# Altium footprint library Ixora.PcbLib: 199 footprints (part 6 of 13)
Each footprint in its own frame and in the unit in brackets; x right, y up, seen from the top. Pads: shape width x height; smd on the part's side, far side on the other; paste and mask are expansions set on the pad; w line width, h text height; cw(c..) or ccw(c..) is an arc to the next point about the centre after c.
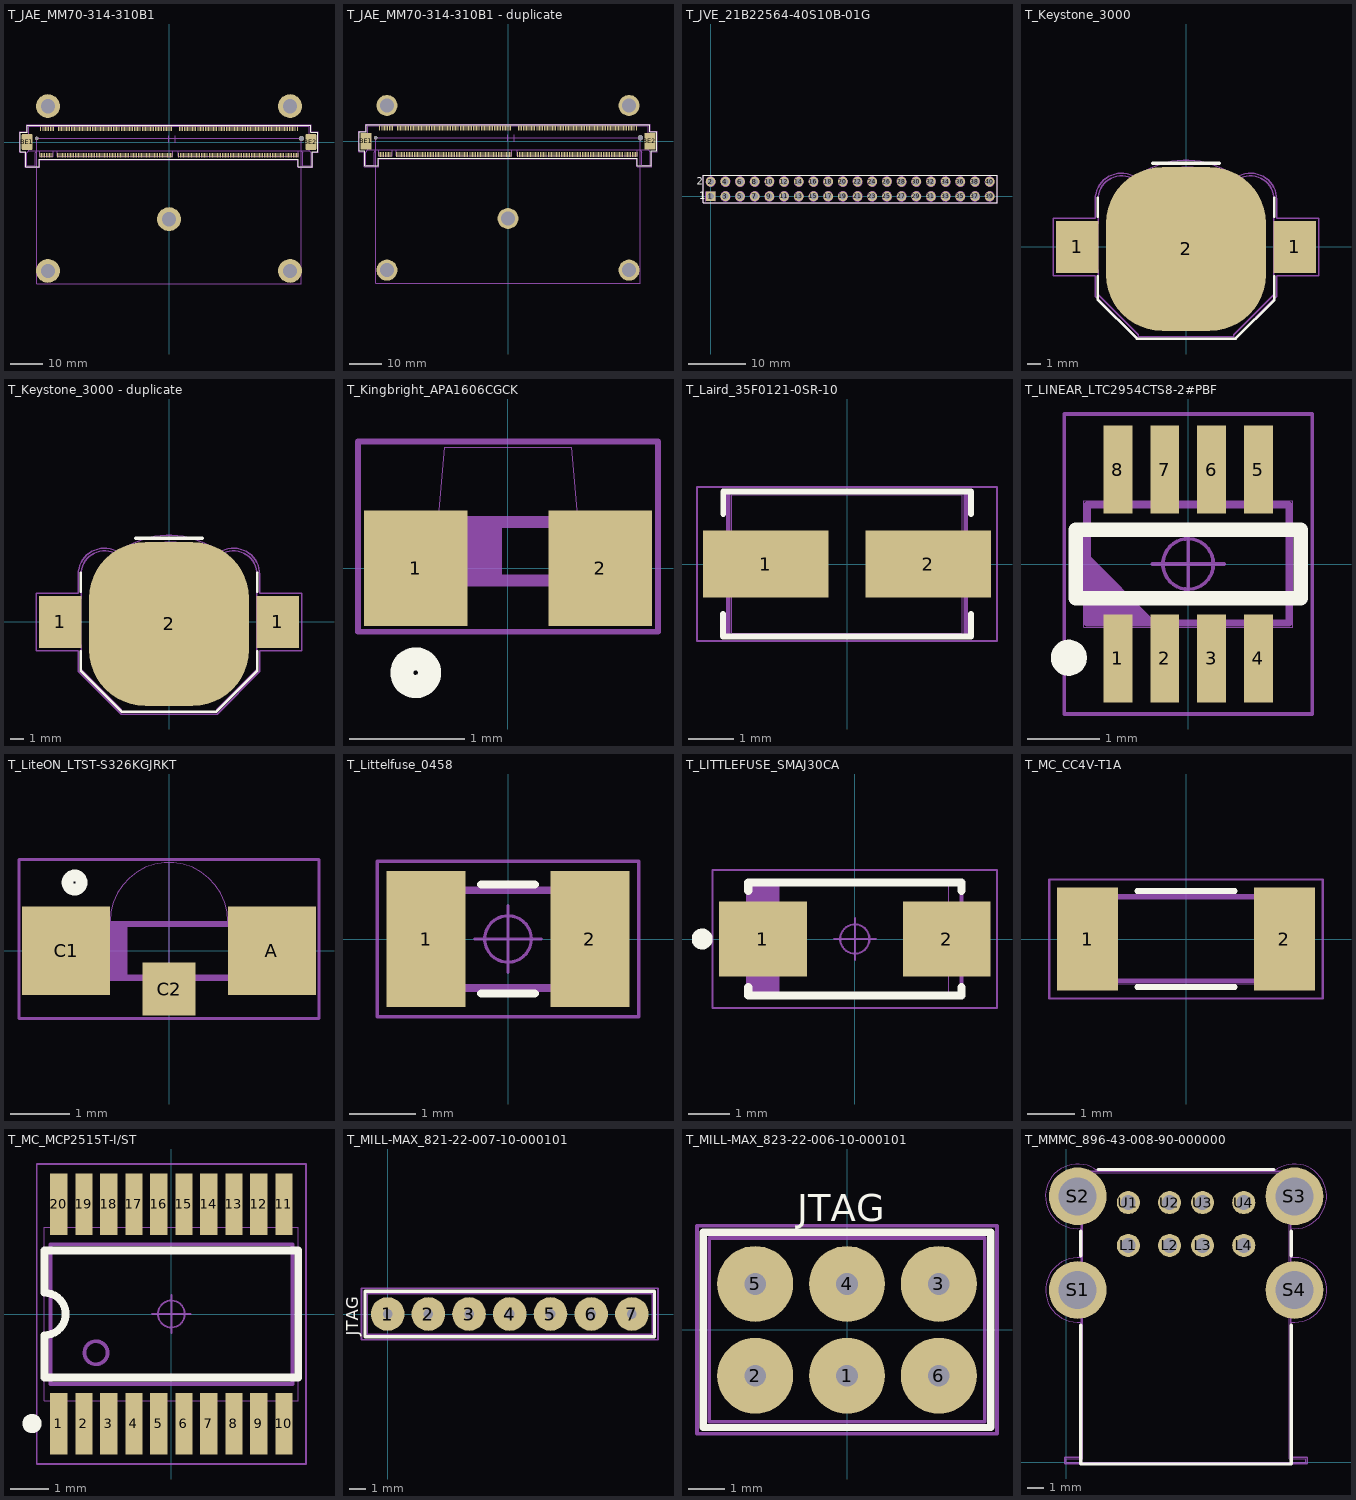
[diagram p5: the footprints below, top view; thin cyan lines are the x and y axes]

## T_JAE_MM70-314-310B1 [mm] "MXM 3.0 Connector"
height 6.7
pads (319):
  rrect50% 0.3x1.5 smd: 1(-40,-4.1) 2(-39.75,4.1) 3(-39.5,-4.1) 4(-39.25,4.1) 5(-39,-4.1) 6(-38.75,4.1) 7(-38.5,-4.1) 8(-38.25,4.1) 9(-38,-4.1) 10(-37.75,4.1) 11(-37.5,-4.1) 12(-37.25,4.1) 13(-37,-4.1) 14(-36.75,4.1) 15(-36.5,-4.1) 16(-36.25,4.1) 17(-36,-4.1) 18(-35.75,4.1) 23(-34.5,-4.1) 24(-34.25,4.1) 25(-34,-4.1) 26(-33.75,4.1) 27(-33.5,-4.1) 28(-33.25,4.1) 29(-33,-4.1) 30(-32.75,4.1) 31(-32.5,-4.1) 32(-32.25,4.1) 33(-32,-4.1) 34(-31.75,4.1) 35(-31.5,-4.1) 36(-31.25,4.1) 37(-31,-4.1) 38(-30.75,4.1) 39(-30.5,-4.1) 40(-30.25,4.1) 41(-30,-4.1) 42(-29.75,4.1) 43(-29.5,-4.1) 44(-29.25,4.1) 45(-29,-4.1) 46(-28.75,4.1) 47(-28.5,-4.1) 48(-28.25,4.1) 49(-28,-4.1) 50(-27.75,4.1) 51(-27.5,-4.1) 52(-27.25,4.1) 53(-27,-4.1) 54(-26.75,4.1) 55(-26.5,-4.1) 56(-26.25,4.1) 57(-26,-4.1) 58(-25.75,4.1) 59(-25.5,-4.1) 60(-25.25,4.1) 61(-25,-4.1) 62(-24.75,4.1) 63(-24.5,-4.1) 64(-24.25,4.1) 65(-24,-4.1) 66(-23.75,4.1) 67(-23.5,-4.1) 68(-23.25,4.1) 69(-23,-4.1) 70(-22.75,4.1) 71(-22.5,-4.1) 72(-22.25,4.1) 73(-22,-4.1) 74(-21.75,4.1) 75(-21.5,-4.1) 76(-21.25,4.1) 77(-21,-4.1) 78(-20.75,4.1) 79(-20.5,-4.1) 80(-20.25,4.1) 81(-20,-4.1) 82(-19.75,4.1) 83(-19.5,-4.1) 84(-19.25,4.1) 85(-19,-4.1) 86(-18.75,4.1) 87(-18.5,-4.1) 88(-18.25,4.1) 89(-18,-4.1) 90(-17.75,4.1) 91(-17.5,-4.1) 92(-17.25,4.1) 93(-17,-4.1) 94(-16.75,4.1) 95(-16.5,-4.1) 96(-16.25,4.1) 97(-16,-4.1) 98(-15.75,4.1) 99(-15.5,-4.1) 100(-15.25,4.1) 101(-15,-4.1) 102(-14.75,4.1) 103(-14.5,-4.1) 104(-14.25,4.1) 105(-14,-4.1) 106(-13.75,4.1) 107(-13.5,-4.1) 108(-13.25,4.1) 109(-13,-4.1) 110(-12.75,4.1) 111(-12.5,-4.1) 112(-12.25,4.1) 113(-12,-4.1) 114(-11.75,4.1) 115(-11.5,-4.1) 116(-11.25,4.1) 117(-11,-4.1) 118(-10.75,4.1) 119(-10.5,-4.1) 120(-10.25,4.1) 121(-10,-4.1) 122(-9.75,4.1) 123(-9.5,-4.1) 124(-9.25,4.1) 125(-9,-4.1) 126(-8.75,4.1) 127(-8.5,-4.1) 128(-8.25,4.1) 129(-8,-4.1) 130(-7.75,4.1) 131(-7.5,-4.1) 132(-7.25,4.1) 133(-7,-4.1) 134(-6.75,4.1) 135(-6.5,-4.1) 136(-6.25,4.1) 137(-6,-4.1) 138(-5.75,4.1) 139(-5.5,-4.1) 140(-5.25,4.1) 141(-5,-4.1) 142(-4.75,4.1) 143(-4.5,-4.1) 144(-4.25,4.1) 145(-4,-4.1) 146(-3.75,4.1) 147(-3.5,-4.1) 148(-3.25,4.1) 149(-3,-4.1) 150(-2.75,4.1) 151(-2.5,-4.1) 152(-2.25,4.1) 153(-2,-4.1) 154(-1.75,4.1) 155(-1.5,-4.1) 156(-1.25,4.1) 157(-1,-4.1) 158(-0.75,4.1) 159(-0.5,-4.1) 160(-0.25,4.1) 161(0,-4.1) 162(0.25,4.1) 163(0.5,-4.1) 164(0.75,4.1) 165(1,-4.1) 173(3,-4.1) 174(3.25,4.1) 175(3.5,-4.1) 176(3.75,4.1) 177(4,-4.1) 178(4.25,4.1) 179(4.5,-4.1) 180(4.75,4.1) 181(5,-4.1) 182(5.25,4.1) 183(5.5,-4.1) 184(5.75,4.1) 185(6,-4.1) 186(6.25,4.1) 187(6.5,-4.1) 188(6.75,4.1) 189(7,-4.1) 190(7.25,4.1) 191(7.5,-4.1) 192(7.75,4.1) 193(8,-4.1) 194(8.25,4.1) 195(8.5,-4.1) 196(8.75,4.1) 197(9,-4.1) 198(9.25,4.1) 199(9.5,-4.1) 200(9.75,4.1) 201(10,-4.1) 202(10.25,4.1) 203(10.5,-4.1) 204(10.75,4.1) 205(11,-4.1) 206(11.25,4.1) 207(11.5,-4.1) 208(11.75,4.1) 209(12,-4.1) 210(12.25,4.1) 211(12.5,-4.1) 212(12.75,4.1) 213(13,-4.1) 214(13.25,4.1) 215(13.5,-4.1) 216(13.75,4.1) 217(14,-4.1) 218(14.25,4.1) 219(14.5,-4.1) 220(14.75,4.1) 221(15,-4.1) 222(15.25,4.1) 223(15.5,-4.1) 224(15.75,4.1) 225(16,-4.1) 226(16.25,4.1) 227(16.5,-4.1) 228(16.75,4.1) 229(17,-4.1) 230(17.25,4.1) 231(17.5,-4.1) 232(17.75,4.1) 233(18,-4.1) 234(18.25,4.1) 235(18.5,-4.1) 236(18.75,4.1) 237(19,-4.1) 238(19.25,4.1) 239(19.5,-4.1) 240(19.75,4.1) 241(20,-4.1) 242(20.25,4.1) 243(20.5,-4.1) 244(20.75,4.1) 245(21,-4.1) 246(21.25,4.1) 247(21.5,-4.1) 248(21.75,4.1) 249(22,-4.1) 250(22.25,4.1) 251(22.5,-4.1) 252(22.75,4.1) 253(23,-4.1) 254(23.25,4.1) 255(23.5,-4.1) 256(23.75,4.1) 257(24,-4.1) 258(24.25,4.1) 259(24.5,-4.1) 260(24.75,4.1) 261(25,-4.1) 262(25.25,4.1) 263(25.5,-4.1) 264(25.75,4.1) 265(26,-4.1) 266(26.25,4.1) 267(26.5,-4.1) 268(26.75,4.1) 269(27,-4.1) 270(27.25,4.1) 271(27.5,-4.1) 272(27.75,4.1) 273(28,-4.1) 274(28.25,4.1) 275(28.5,-4.1) 276(28.75,4.1) 277(29,-4.1) 278(29.25,4.1) 279(29.5,-4.1) 280(29.75,4.1) 281(30,-4.1) 282(30.25,4.1) 283(30.5,-4.1) 284(30.75,4.1) 285(31,-4.1) 286(31.25,4.1) 287(31.5,-4.1) 288(31.75,4.1) 289(32,-4.1) 290(32.25,4.1) 291(32.5,-4.1) 292(32.75,4.1) 293(33,-4.1) 294(33.25,4.1) 295(33.5,-4.1) 296(33.75,4.1) 297(34,-4.1) 298(34.25,4.1) 299(34.5,-4.1) 300(34.75,4.1) 301(35,-4.1) 302(35.25,4.1) 303(35.5,-4.1) 304(35.75,4.1) 305(36,-4.1) 306(36.25,4.1) 307(36.5,-4.1) 308(36.75,4.1) 309(37,-4.1) 310(37.25,4.1) 311(37.5,-4.1) 312(37.75,4.1) 313(38,-4.1) 314(38.25,4.1) 315(38.5,-4.1) 316(38.75,4.1) 317(39,-4.1) 318(39.25,4.1) 319(39.5,-4.1) 320(39.75,4.1) 321(40,-4.1)
  rrect25% 3.3x5 smd: BE1(-43.95,0) BE2(43.95,0)
  round 1.1 hole 1.1 unplated: ""(-41,1.1)
  round 7.4 / inner round 0 / far side round 0 hole 4.4 unplated: ""(-37.5,-39.9) ""(-37.5,11.1) ""(0,-23.9) ""(37.5,-39.9) ""(37.5,11.1)
  round 1.6 hole 1.6 unplated: ""(41,1.1)
Top Overlay:
  lines w0.2: -46.069,-3 -46.069,3 -43.82,3 -43.82,5.17 43.87,5.17 43.87,3 46.069,3 46.069,-3 44.33,-3 44.33,-7.65 40.09,-7.65 40.09,-5.29 -40.12,-5.29 -40.12,-7.65 -44.33,-7.65 -44.33,-3 -46.069,-3
Top Paste:
  drawing of 20 lines, arcs and shapes, not listed
Mechanical 3:
  lines w0.1: -40.9,-2.65 -41.4,-3.35 -41.4,-7.35 -44,-7.35 -44,-3.35 -43.5,-2.65 ; -40.1,-2.65 -40.1,-4.45 -35.9,-4.45 -35.9,-2.65 ; -34.6,-2.65 -34.6,-4.45 1.1,-4.45 1.1,-2.65 ; 2.9,-2.65 2.9,-4.45 40.1,-4.45 40.1,-2.65 ; 40.9,-2.65 41.4,-3.35 41.4,-7.35 44,-7.35 44,-3.35 43.5,-2.65 ; -43.5,-2.65 43.5,-2.65 ; -43.5,-2.65 -43.5,-2 -44.95,-2 -44.95,2 -43.5,2 -43.5,4.85 43.5,4.85 43.5,2 44.95,2 44.95,-2 43.5,-2 43.5,-2.65
Mechanical 13:
  circle w0.1: c37.5,11.1 r3
  circle w0.1: c-37.5,11.1 r3
  circle w0.1: c-37.5,-39.9 r3
  circle w0.1: c0,-23.9 r3
  circle w0.1: c37.5,-39.9 r3
  lines w0.001: -40.9,-2.65 -41.4,-3.35 -41.4,-7.35 -44,-7.35 -44,-3.35 -43.5,-2.65 ; -40.1,-2.65 -40.1,-4.45 -35.9,-4.45 -35.9,-2.65 ; -34.6,-2.65 -34.6,-4.45 1.1,-4.45 1.1,-2.65 ; 0,0 0,2 ; 2,0 2,2 ; 2.9,-2.65 2.9,-4.45 40.1,-4.45 40.1,-2.65 ; 40.9,-2.65 41.4,-3.35 41.4,-7.35 44,-7.35 44,-3.35 43.5,-2.65 ; -43.5,-2.65 43.5,-2.65 ; -43.5,-2.65 -43.5,-2 -44.95,-2 -44.95,2 -43.5,2 -43.5,4.85 43.5,4.85 43.5,2 44.95,2 44.95,-2 43.5,-2 43.5,-2.65 ; -41,-43.9 41,-43.9 41,1.1 -41,1.1 -41,-43.9
  lines w0.05: 39.92,-7.82 39.92,-5.46 -39.95,-5.46 -39.95,-7.82 -44.5,-7.82 -44.5,-3.17 -46.24,-3.17 -46.24,3.17 -43.99,3.17 -43.99,5.34 44.04,5.34 44.04,3.16 46.24,3.16 46.24,-3.17 44.5,-3.17 44.5,-7.82 39.95,-7.82
3D body "9774080360.stp": height 8.01, standoff -1.39, extent 34.506,8.1 40.494,14.076
3D body "9774080360.stp": height 8.01, standoff -1.39, extent -40.494,8.1 -34.506,14.076
3D body "CON-JAE-MM70-314-310B1.STEP": height 6.72, standoff -0.98, extent -44.95,-7.35 44.95,4.85
3D body "9774030360.stp": height 3.01, standoff -1.39, extent -40.494,-42.9 -34.506,-36.924
3D body "9774030360.stp": height 3.01, standoff -1.39, extent -2.994,-26.9 2.994,-20.924
3D body "9774030360.stp": height 3.01, standoff -1.39, extent 34.506,-42.9 40.494,-36.924

## T_JAE_MM70-314-310B1 - duplicate [mm] "MXM 3.0 Connector"
height 6.7
pads (319):
  rect 0.3x1.5 smd: 1(-40,-4.1) 2(-39.75,4.1) 3(-39.5,-4.1) 4(-39.25,4.1) 5(-39,-4.1) 6(-38.75,4.1) 7(-38.5,-4.1) 8(-38.25,4.1) 9(-38,-4.1) 10(-37.75,4.1) 11(-37.5,-4.1) 12(-37.25,4.1) 13(-37,-4.1) 14(-36.75,4.1) 15(-36.5,-4.1) 16(-36.25,4.1) 17(-36,-4.1) 18(-35.75,4.1) 23(-34.5,-4.1) 24(-34.25,4.1) 25(-34,-4.1) 26(-33.75,4.1) 27(-33.5,-4.1) 28(-33.25,4.1) 29(-33,-4.1) 30(-32.75,4.1) 31(-32.5,-4.1) 32(-32.25,4.1) 33(-32,-4.1) 34(-31.75,4.1) 35(-31.5,-4.1) 36(-31.25,4.1) 37(-31,-4.1) 38(-30.75,4.1) 39(-30.5,-4.1) 40(-30.25,4.1) 41(-30,-4.1) 42(-29.75,4.1) 43(-29.5,-4.1) 44(-29.25,4.1) 45(-29,-4.1) 46(-28.75,4.1) 47(-28.5,-4.1) 48(-28.25,4.1) 49(-28,-4.1) 50(-27.75,4.1) 51(-27.5,-4.1) 52(-27.25,4.1) 53(-27,-4.1) 54(-26.75,4.1) 55(-26.5,-4.1) 56(-26.25,4.1) 57(-26,-4.1) 58(-25.75,4.1) 59(-25.5,-4.1) 60(-25.25,4.1) 61(-25,-4.1) 62(-24.75,4.1) 63(-24.5,-4.1) 64(-24.25,4.1) 65(-24,-4.1) 66(-23.75,4.1) 67(-23.5,-4.1) 68(-23.25,4.1) 69(-23,-4.1) 70(-22.75,4.1) 71(-22.5,-4.1) 72(-22.25,4.1) 73(-22,-4.1) 74(-21.75,4.1) 75(-21.5,-4.1) 76(-21.25,4.1) 77(-21,-4.1) 78(-20.75,4.1) 79(-20.5,-4.1) 80(-20.25,4.1) 81(-20,-4.1) 82(-19.75,4.1) 83(-19.5,-4.1) 84(-19.25,4.1) 85(-19,-4.1) 86(-18.75,4.1) 87(-18.5,-4.1) 88(-18.25,4.1) 89(-18,-4.1) 90(-17.75,4.1) 91(-17.5,-4.1) 92(-17.25,4.1) 93(-17,-4.1) 94(-16.75,4.1) 95(-16.5,-4.1) 96(-16.25,4.1) 97(-16,-4.1) 98(-15.75,4.1) 99(-15.5,-4.1) 100(-15.25,4.1) 101(-15,-4.1) 102(-14.75,4.1) 103(-14.5,-4.1) 104(-14.25,4.1) 105(-14,-4.1) 106(-13.75,4.1) 107(-13.5,-4.1) 108(-13.25,4.1) 109(-13,-4.1) 110(-12.75,4.1) 111(-12.5,-4.1) 112(-12.25,4.1) 113(-12,-4.1) 114(-11.75,4.1) 115(-11.5,-4.1) 116(-11.25,4.1) 117(-11,-4.1) 118(-10.75,4.1) 119(-10.5,-4.1) 120(-10.25,4.1) 121(-10,-4.1) 122(-9.75,4.1) 123(-9.5,-4.1) 124(-9.25,4.1) 125(-9,-4.1) 126(-8.75,4.1) 127(-8.5,-4.1) 128(-8.25,4.1) 129(-8,-4.1) 130(-7.75,4.1) 131(-7.5,-4.1) 132(-7.25,4.1) 133(-7,-4.1) 134(-6.75,4.1) 135(-6.5,-4.1) 136(-6.25,4.1) 137(-6,-4.1) 138(-5.75,4.1) 139(-5.5,-4.1) 140(-5.25,4.1) 141(-5,-4.1) 142(-4.75,4.1) 143(-4.5,-4.1) 144(-4.25,4.1) 145(-4,-4.1) 146(-3.75,4.1) 147(-3.5,-4.1) 148(-3.25,4.1) 149(-3,-4.1) 150(-2.75,4.1) 151(-2.5,-4.1) 152(-2.25,4.1) 153(-2,-4.1) 154(-1.75,4.1) 155(-1.5,-4.1) 156(-1.25,4.1) 157(-1,-4.1) 158(-0.75,4.1) 159(-0.5,-4.1) 160(-0.25,4.1) 161(0,-4.1) 162(0.25,4.1) 163(0.5,-4.1) 164(0.75,4.1) 165(1,-4.1) 173(3,-4.1) 174(3.25,4.1) 175(3.5,-4.1) 176(3.75,4.1) 177(4,-4.1) 178(4.25,4.1) 179(4.5,-4.1) 180(4.75,4.1) 181(5,-4.1) 182(5.25,4.1) 183(5.5,-4.1) 184(5.75,4.1) 185(6,-4.1) 186(6.25,4.1) 187(6.5,-4.1) 188(6.75,4.1) 189(7,-4.1) 190(7.25,4.1) 191(7.5,-4.1) 192(7.75,4.1) 193(8,-4.1) 194(8.25,4.1) 195(8.5,-4.1) 196(8.75,4.1) 197(9,-4.1) 198(9.25,4.1) 199(9.5,-4.1) 200(9.75,4.1) 201(10,-4.1) 202(10.25,4.1) 203(10.5,-4.1) 204(10.75,4.1) 205(11,-4.1) 206(11.25,4.1) 207(11.5,-4.1) 208(11.75,4.1) 209(12,-4.1) 210(12.25,4.1) 211(12.5,-4.1) 212(12.75,4.1) 213(13,-4.1) 214(13.25,4.1) 215(13.5,-4.1) 216(13.75,4.1) 217(14,-4.1) 218(14.25,4.1) 219(14.5,-4.1) 220(14.75,4.1) 221(15,-4.1) 222(15.25,4.1) 223(15.5,-4.1) 224(15.75,4.1) 225(16,-4.1) 226(16.25,4.1) 227(16.5,-4.1) 228(16.75,4.1) 229(17,-4.1) 230(17.25,4.1) 231(17.5,-4.1) 232(17.75,4.1) 233(18,-4.1) 234(18.25,4.1) 235(18.5,-4.1) 236(18.75,4.1) 237(19,-4.1) 238(19.25,4.1) 239(19.5,-4.1) 240(19.75,4.1) 241(20,-4.1) 242(20.25,4.1) 243(20.5,-4.1) 244(20.75,4.1) 245(21,-4.1) 246(21.25,4.1) 247(21.5,-4.1) 248(21.75,4.1) 249(22,-4.1) 250(22.25,4.1) 251(22.5,-4.1) 252(22.75,4.1) 253(23,-4.1) 254(23.25,4.1) 255(23.5,-4.1) 256(23.75,4.1) 257(24,-4.1) 258(24.25,4.1) 259(24.5,-4.1) 260(24.75,4.1) 261(25,-4.1) 262(25.25,4.1) 263(25.5,-4.1) 264(25.75,4.1) 265(26,-4.1) 266(26.25,4.1) 267(26.5,-4.1) 268(26.75,4.1) 269(27,-4.1) 270(27.25,4.1) 271(27.5,-4.1) 272(27.75,4.1) 273(28,-4.1) 274(28.25,4.1) 275(28.5,-4.1) 276(28.75,4.1) 277(29,-4.1) 278(29.25,4.1) 279(29.5,-4.1) 280(29.75,4.1) 281(30,-4.1) 282(30.25,4.1) 283(30.5,-4.1) 284(30.75,4.1) 285(31,-4.1) 286(31.25,4.1) 287(31.5,-4.1) 288(31.75,4.1) 289(32,-4.1) 290(32.25,4.1) 291(32.5,-4.1) 292(32.75,4.1) 293(33,-4.1) 294(33.25,4.1) 295(33.5,-4.1) 296(33.75,4.1) 297(34,-4.1) 298(34.25,4.1) 299(34.5,-4.1) 300(34.75,4.1) 301(35,-4.1) 302(35.25,4.1) 303(35.5,-4.1) 304(35.75,4.1) 305(36,-4.1) 306(36.25,4.1) 307(36.5,-4.1) 308(36.75,4.1) 309(37,-4.1) 310(37.25,4.1) 311(37.5,-4.1) 312(37.75,4.1) 313(38,-4.1) 314(38.25,4.1) 315(38.5,-4.1) 316(38.75,4.1) 317(39,-4.1) 318(39.25,4.1) 319(39.5,-4.1) 320(39.75,4.1) 321(40,-4.1)
  rect 3.3x5 smd: BE1(-43.95,0) BE2(43.95,0)
  round 1.1 hole 1.1 unplated: ""(-41,1.1)
  round 6.5 hole 4.33: ""(-37.5,-39.9) ""(-37.5,11.1) ""(0,-23.9) ""(37.5,-39.9) ""(37.5,11.1)
  round 1.6 hole 1.6 unplated: ""(41,1.1)
Top Overlay:
  lines w0.2: -46.069,-3 -46.069,3 -43.82,3 -43.82,5.17 43.87,5.17 43.87,3 46.069,3 46.069,-3 44.33,-3 44.33,-7.65 40.09,-7.65 40.09,-5.29 -40.12,-5.29 -40.12,-7.65 -44.33,-7.65 -44.33,-3 -46.069,-3
Mechanical 2:
  lines w0.001: -40.9,-2.65 -41.4,-3.35 -41.4,-7.35 -44,-7.35 -44,-3.35 -43.5,-2.65 ; -40.1,-2.65 -40.1,-4.45 -35.9,-4.45 -35.9,-2.65 ; -34.6,-2.65 -34.6,-4.45 1.1,-4.45 1.1,-2.65 ; 0,0 0,2 ; 2,0 2,2 ; 2.9,-2.65 2.9,-4.45 40.1,-4.45 40.1,-2.65 ; 40.9,-2.65 41.4,-3.35 41.4,-7.35 44,-7.35 44,-3.35 43.5,-2.65 ; -43.5,-2.65 -43.5,-2 -44.95,-2 -44.95,2 -43.5,2 -43.5,4.85 43.5,4.85 43.5,2 44.95,2 44.95,-2 43.5,-2 43.5,-2.65 ; -43.5,-2.65 43.5,-2.65 ; -41,-43.9 -41,1.1 41,1.1 41,-43.9 -41,-43.9
Mechanical 3:
  lines w0.1: -40.9,-2.65 -41.4,-3.35 -41.4,-7.35 -44,-7.35 -44,-3.35 -43.5,-2.65 ; -40.1,-2.65 -40.1,-4.45 -35.9,-4.45 -35.9,-2.65 ; -34.6,-2.65 -34.6,-4.45 1.1,-4.45 1.1,-2.65 ; 2.9,-2.65 2.9,-4.45 40.1,-4.45 40.1,-2.65 ; 40.9,-2.65 41.4,-3.35 41.4,-7.35 44,-7.35 44,-3.35 43.5,-2.65 ; -43.5,-2.65 43.5,-2.65 ; -43.5,-2.65 -43.5,-2 -44.95,-2 -44.95,2 -43.5,2 -43.5,4.85 43.5,4.85 43.5,2 44.95,2 44.95,-2 43.5,-2 43.5,-2.65
Mechanical 13:
  lines w0.05: 39.92,-7.82 39.92,-5.46 -39.95,-5.46 -39.95,-7.82 -44.5,-7.82 -44.5,-3.17 -46.24,-3.17 -46.24,3.17 -43.99,3.17 -43.99,5.34 44.04,5.34 44.04,3.16 46.24,3.16 46.24,-3.17 44.5,-3.17 44.5,-7.82 39.95,-7.82
3D body "Heatspreader V1.0.001.STEP": height 12, standoff 4.2, extent -41,-43.9 41,15.1
3D body "CON-JAE-MM70-314-310B1.STEP": height 6.72, standoff -0.98, extent -44.95,-7.35 44.95,4.85
3D body "Fastner3mm.STEP": height 3.02, standoff -1.51, extent -40.269,-42.674 -34.731,-37.126
3D body "Fastner3mm.STEP": height 3.02, standoff -1.51, extent 34.731,-42.674 40.269,-37.126
3D body "Fastner3mm.STEP": height 3.02, standoff -1.51, extent -2.769,-26.674 2.769,-21.126
3D body "Fastner8mm.STEP": height 8.02, standoff -1.51, extent 34.731,8.326 40.269,13.874
3D body "Fastner8mm.STEP": height 8.02, standoff -1.51, extent -40.269,8.326 -34.731,13.874
3D body "Module with CPU.STEP": height 5.95, standoff 3.02, extent -41,-43.9 41,1.1

## T_JVE_21B22564-40S10B-01G [mm] "Header 2x20"
height 8.6
pads (40):
  rect 1.65x1.65 hole 1.15: 1(0,0)
  round 1.65 hole 1.15: 2(0,2.54) 3(2.54,0) 4(2.54,2.54) 5(5.08,0) 6(5.08,2.54) 7(7.62,0) 8(7.62,2.54) 9(10.16,0) 10(10.16,2.54) 11(12.7,0) 12(12.7,2.54) 13(15.24,0) 14(15.24,2.54) 15(17.78,0) 16(17.78,2.54) 17(20.32,0) 18(20.32,2.54) 19(22.86,0) 20(22.86,2.54) 21(25.4,0) 22(25.4,2.54) 23(27.94,0) 24(27.94,2.54) 25(30.48,0) 26(30.48,2.54) 27(33.02,0) 28(33.02,2.54) 29(35.56,0) 30(35.56,2.54) 31(38.1,0) 32(38.1,2.54) 33(40.64,0) 34(40.64,2.54) 35(43.18,0) 36(43.18,2.54) 37(45.72,0) 38(45.72,2.54) 39(48.26,0) 40(48.26,2.54)
Top Overlay:
  lines w0.2: -1.27,-1.14 49.53,-1.14 49.53,3.68 -1.27,3.68 -1.27,-1.137
  text "2" at -2.364,2.048 h1.27
  text "1" at -1.941,-0.522 h1.27
Mechanical 1:
  circle w0.05: c0,0 r0.35
  lines w0.05: -1.27,-1.14 49.53,-1.14 49.53,3.68 -1.27,3.68 -1.27,-1.137 ; -0.5,0 0.5,0 ; 0,-0.5 0,0.5
Mechanical 2:
  lines w0.001: -1.27,-1.14 49.53,-1.14 49.53,3.68 -1.27,3.68 -1.27,-1.14
Mechanical 3:
  circle w0.1: c0,2.54 r0.825
  circle w0.1: c2.54,0 r0.825
  circle w0.1: c2.54,2.54 r0.825
  circle w0.1: c5.08,0 r0.825
  circle w0.1: c5.08,2.54 r0.825
  circle w0.1: c7.62,0 r0.825
  circle w0.1: c7.62,2.54 r0.825
  circle w0.1: c10.16,0 r0.825
  circle w0.1: c10.16,2.54 r0.825
  circle w0.1: c12.7,0 r0.825
  circle w0.1: c12.7,2.54 r0.825
  circle w0.1: c15.24,0 r0.825
  circle w0.1: c15.24,2.54 r0.825
  circle w0.1: c17.78,0 r0.825
  circle w0.1: c17.78,2.54 r0.825
  circle w0.1: c20.32,0 r0.825
  circle w0.1: c20.32,2.54 r0.825
  circle w0.1: c22.86,0 r0.825
  circle w0.1: c22.86,2.54 r0.825
  circle w0.1: c25.4,0 r0.825
  circle w0.1: c25.4,2.54 r0.825
  circle w0.1: c27.94,0 r0.825
  circle w0.1: c27.94,2.54 r0.825
  circle w0.1: c30.48,0 r0.825
  circle w0.1: c30.48,2.54 r0.825
  circle w0.1: c33.02,0 r0.825
  circle w0.1: c33.02,2.54 r0.825
  circle w0.1: c35.56,0 r0.825
  circle w0.1: c35.56,2.54 r0.825
  circle w0.1: c38.1,0 r0.825
  circle w0.1: c38.1,2.54 r0.825
  circle w0.1: c40.64,0 r0.825
  circle w0.1: c40.64,2.54 r0.825
  circle w0.1: c43.18,0 r0.825
  circle w0.1: c43.18,2.54 r0.825
  circle w0.1: c45.72,0 r0.825
  circle w0.1: c45.72,2.54 r0.825
  circle w0.1: c48.26,0 r0.825
  circle w0.1: c48.26,2.54 r0.825
  lines w0.1: -1.27,-1.14 49.53,-1.14 49.53,3.68 -1.27,3.68 -1.27,-1.137 ; -0.825,-0.825 -0.825,0.825 0.825,0.825 0.825,-0.825
3D body "TSW-120-07-X-D.step": height 8.4, standoff -2.52, extent -1.27,-1.27 49.53,3.81

## T_Keystone_3000 [mm] "Battery Holder, 12mm (Dia)"
height 3.18
pads (3):
  rect 3.2x3.9 smd: 1(-8.17,0) 1(8.17,0)
  rrect70% 12x12.3 smd paste-11: 2(0,-0.15)
Top Overlay:
  lines w0.2: -6.631,-2.21 -6.631,-3.935 -3.683,-6.883 3.523,-6.883 3.734,-6.883 6.631,-3.986 6.631,-2.21 ; -6.631,2.261 -6.631,3.689 ; 6.631,2.261 6.631,3.689
  lines w0.254: -2.5,6.3 2.5,6.3
Mechanical 1:
  lines w0.1: -6.808,3.568 cw(c-4.849,3.588) -3.782,5.231 ; -6.808,3.588 -6.808,2.159 -9.982,2.159 -9.982,-2.159 -6.807,-2.159 -6.807,-3.683 -3.581,-6.909 3.607,-6.909 6.833,-3.683 6.833,-2.159 9.982,-2.159 9.982,2.159 6.809,2.159 6.809,3.57 ; -3.785,5.233 cw(c0,0.323) 3.785,5.233 ; 3.782,5.231 cw(c4.849,3.588) 6.807,3.568
Mechanical 2:
  circle w0.001: c0,0 r6
  circle w0.001: c8.185,0 r1.2
  circle w0.001: c-8.185,0 r1.2
  lines w0.001: -6.605,-1.585 -9.46,-1.585 -9.46,1.585 -6.605,1.585 ; -6.605,3.588 -6.605,-3.57 -6.59,-3.57 -3.57,-6.59 -3.57,-6.725 3.57,-6.725 3.57,-6.59 6.59,-3.57 6.605,-3.57 6.605,3.588 ; -6.605,3.57 cw(c-4.849,3.588) -3.585,4.808 ccw(c0,9.619) 3.586,4.808 cw(c4.849,3.588) 6.605,3.57 ; 6.605,-1.585 9.46,-1.585 9.46,1.585 6.605,1.585
Mechanical 3:
  lines w0.1: -6.605,-1.723 -6.605,-3.57 -6.59,-3.57 -3.57,-6.59 -3.57,-6.725 3.57,-6.725 3.57,-6.59 6.59,-3.57 6.605,-3.57 6.605,-1.723 ; -6.604,-1.723 -9.578,-1.723 -9.578,1.727 -6.605,1.727 -6.605,3.57 cw(c-4.849,3.588) -3.585,4.808 ccw(c0,9.619) 3.586,4.808 cw(c4.849,3.588) 6.605,3.57 ; 6.604,-1.724 9.575,-1.724 9.575,1.73 6.605,1.73 ; 6.605,1.727 6.605,3.57
3D body "keystone-PN3000.STEP": height 3.16, standoff -0.01, extent -9.474,-6.923 9.474,5.142

## T_Keystone_3000 - duplicate [mm] "Battery Holder, 12mm (Dia)"
height 3.18
pads (3):
  rect 3.2x3.9 smd: 1(-8.17,0) 1(8.17,0)
  rrect70% 12x12.3 smd paste-11: 2(0,-0.15)
Top Overlay:
  lines w0.2: -6.631,-2.21 -6.631,-3.638 -3.517,-6.752 3.523,-6.752 3.523,-6.746 6.631,-3.638 6.631,-2.21 ; -6.631,2.261 -6.631,3.689 ; 6.631,2.261 6.631,3.689
  lines w0.254: -2.5,6.3 2.5,6.3
Mechanical 1:
  lines w0.1: -6.808,3.568 cw(c-4.849,3.588) -3.782,5.231 ; -6.808,3.588 -6.808,2.159 -9.982,2.159 -9.982,-2.159 -6.807,-2.159 -6.807,-3.683 -3.581,-6.909 3.607,-6.909 6.833,-3.683 6.833,-2.159 9.982,-2.159 9.982,2.159 6.809,2.159 6.809,3.57 ; -3.785,5.233 cw(c0,0.323) 3.785,5.233 ; 3.782,5.231 cw(c4.849,3.588) 6.807,3.568
Mechanical 2:
  circle w0.001: c-8.185,0 r1.2
  circle w0.001: c8.185,0 r1.2
  circle w0.001: c0,0 r6
  lines w0.001: -6.605,-1.585 -9.46,-1.585 -9.46,1.585 -6.605,1.585 ; -6.605,3.588 -6.605,-3.57 -6.59,-3.57 -3.57,-6.59 -3.57,-6.725 3.57,-6.725 3.57,-6.59 6.59,-3.57 6.605,-3.57 6.605,3.588 ; -6.605,3.57 cw(c-4.849,3.588) -3.585,4.808 ccw(c0,9.619) 3.586,4.808 cw(c4.849,3.588) 6.605,3.57 ; -3.57,5.345 3.57,5.345 ; 6.605,-1.585 9.46,-1.585 9.46,1.585 6.605,1.585
Mechanical 3:
  lines w0.1: -6.605,-1.723 -6.605,-3.57 -6.59,-3.57 -3.57,-6.59 -3.57,-6.725 3.57,-6.725 3.57,-6.59 6.59,-3.57 6.605,-3.57 6.605,-1.723 ; -6.604,-1.723 -9.578,-1.723 -9.578,1.727 -6.605,1.727 -6.605,3.57 cw(c-4.849,3.588) -3.585,4.808 ccw(c0,9.619) 3.586,4.808 cw(c4.849,3.588) 6.605,3.57 ; 6.604,-1.724 9.575,-1.724 9.575,1.73 6.605,1.73 ; 6.605,1.727 6.605,3.57
3D body "keystone-PN3000.STEP": height 3.16, standoff -0.01, extent -9.474,-6.72 9.474,5.345

## T_Kingbright_APA1606CGCK [mm] "LED Kingbright APA1606CGCK Green"
height 0.6
pads (2):
  rect 0.9x1 smd: 1(-0.8,0) 2(0.8,0)
Top Overlay:
  circle w0.2: c-0.8,-0.905 r0.12
Mechanical 1:
  lines w0.05: -1.3,-0.55 1.3,-0.55 1.3,1.1 -1.3,1.1 -1.3,-0.55
Mechanical 2:
  lines w0.01: -0.6,0.45 -0.55,1.05 0.55,1.05 0.6,0.45 ; -0.9,-0.15 0.9,-0.15 0.9,0.45 -0.9,0.45 -0.9,-0.15
Mechanical 3:
  lines w0.1: -0.7,-0.105 -0.7,0.4 ; -0.6,-0.105 -0.6,0.4 ; -0.5,-0.105 -0.5,0.4 ; -0.4,-0.105 -0.4,0.4 ; -0.3,-0.105 -0.3,0.4 ; -0.2,-0.105 -0.2,0.4 ; -0.1,-0.105 -0.1,0.4 ; -0.8,-0.105 0.8,-0.105 0.8,0.4 -0.8,0.4 ; -0.8,-0.105 -0.8,0.4 ; -0.8,-0.105 -0.8,0.4
3D body: height 0.55, standoff 0, extent -0.6,0.45 0.6,1.05
3D body: height 0.6, standoff 0, extent -0.9,-0.15 0.9,0.45

## T_Laird_35F0121-0SR-10 [mm] "Power supply FB 10A"
height 3.05
pads (2):
  rect 2.77x1.47 smd: 1(-1.79,0) 2(1.79,0)
Top Overlay:
  lines w0.127: -2.732,-1.102 -2.732,-1.599 2.73,-1.599 2.73,-1.104 ; -2.729,1.104 -2.729,1.599 2.73,1.599 2.73,1.104
Mechanical 1:
  lines w0.05: -3.306,-1.695 -3.306,1.695 3.305,1.695 3.305,-1.695 -3.306,-1.695
Mechanical 2:
  lines w0.001: -2.54,-1.525 -2.54,1.525 2.54,1.525 2.54,-1.525 -2.54,-1.525
Mechanical 3:
  lines w0.1: -2.614,-1.599 2.614,-1.599 2.614,1.599 -2.614,1.599 -2.614,-1.599
3D body: height 3.05, standoff 0, extent -2.54,-1.525 2.54,1.525

## T_LINEAR_LTC2954CTS8-2#PBF [mm]
height 1
pads (8):
  rect 0.4x1.22 smd: 1(-0.975,-1.31) 2(-0.325,-1.31) 3(0.325,-1.31) 4(0.975,-1.31) 5(0.975,1.31) 6(0.325,1.31) 7(-0.325,1.31) 8(-0.975,1.31)
Top Overlay:
  circle w0.25: c-1.655,-1.3 r0.125
  lines w0.2: -1.56,-0.475 1.56,-0.475 1.56,0.475 -1.56,0.475 -1.56,-0.475
Mechanical 1:
  circle w0.05: c0,0 r0.35
  lines w0.05: -1.72,-2.08 1.72,-2.08 ; -1.72,-2.07 -1.72,2.08 1.72,2.08 1.72,-2.07 ; -0.5,0 0.5,0 ; 0,-0.5 0,0.5
Mechanical 2:
  lines w0.001: -1.45,-0.875 -1.45,0.875 1.45,0.875 1.45,-0.875 -1.45,-0.875
Mechanical 3:
  lines w0.1: -1.4,-0.72 -1.3,-0.82 ; -1.4,-0.62 -1.2,-0.82 ; -1.4,-0.52 -1.1,-0.82 ; -1.4,-0.42 -1,-0.82 ; -1.4,-0.32 -0.9,-0.82 ; -1.4,-0.22 -0.8,-0.82 ; -1.4,-0.12 -0.7,-0.82 ; -1.4,-0.02 -0.6,-0.82 ; -1.4,0.08 -0.5,-0.82 ; -1.4,-0.82 1.4,-0.82 1.4,0.82 -1.4,0.82 -1.4,-0.82
3D body: height 1, standoff 0, extent -1.45,-0.875 1.45,0.875

## T_LiteON_LTST-S326KGJRKT [mm] "LED LiteON LTST-S326KGJRKT Red Green"
height 1
pads (3):
  rect 1.5x1.5 smd: A(1.75,0) C1(-1.75,0)
  rect 0.9x0.9 smd: C2(0,-0.65)
Top Overlay:
  circle w0.2: c-1.605,1.16 r0.12
Mechanical 1:
  lines w0.05: -2.55,-1.15 2.55,-1.15 2.55,1.55 -2.55,1.55 -2.55,-1.15
Mechanical 2:
  lines w0.01: -1,0.5 cw(c0,0.5) 1,0.5 ; 0,-0.5 0,1.5 ; -1.5,-0.5 1.5,-0.5 1.5,0.5 -1.5,0.5 -1.5,-0.5
Mechanical 3:
  lines w0.1: -1.355,-0.455 -1.355,0.455 ; -1.255,-0.455 -1.255,0.455 ; -1.155,-0.455 -1.155,0.455 ; -1.055,-0.455 -1.055,0.455 ; -0.955,-0.455 -0.955,0.455 ; -0.855,-0.455 -0.855,0.455 ; -0.755,-0.455 -0.755,0.455 ; -1.455,-0.455 -1.455,0.455 ; -1.455,-0.455 -1.455,0.455 ; -1.455,-0.455 1.455,-0.455 1.455,0.455 -1.455,0.455
3D body: height 0.9, standoff 0, extent 0,0.5 1,1.5
3D body: height 1, standoff 0, extent 0,-0.5 1.5,0.5
3D body: height 0.9, standoff 0, extent -1,0.5 0,1.5
3D body: height 1, standoff 0, extent -1.5,-0.5 0,0.5

## T_Littelfuse_0458 [mm] "Fast Fuse"
height 1.575
pads (2):
  rect 1.185x2.05 smd: 1(-1.232,0) 2(1.232,0)
Top Overlay:
  lines w0.127: -0.4,-0.82 0.4,-0.82 ; -0.4,0.82 0.4,0.82
Mechanical 1:
  circle w0.05: c0,0 r0.35
  lines w0.05: -0.5,0 0.5,0 ; 0,-0.5 0,0.5 ; -1.97,-1.17 -1.97,1.17 1.97,1.17 1.97,-1.17 -1.97,-1.17
Mechanical 2:
  lines w0.01: -0.685,-0.787 -0.685,0.787 ; 0.685,-0.787 0.685,0.787 ; -1.587,-0.787 -1.587,0.787 1.587,0.787 1.587,-0.787 -1.587,-0.787
Mechanical 3:
  lines w0.1: -1.53,-0.73 -1.53,0.73 1.53,0.73 1.53,-0.73 -1.53,-0.73
3D body: height 1.58, standoff 0, extent -1.587,-0.787 -0.795,0.79
3D body: height 1.4, standoff 0, extent -0.795,-0.68 0.795,0.68
3D body: height 1.58, standoff 0, extent 0.795,-0.79 1.587,0.787

## T_LITTLEFUSE_SMAJ30CA [mm] "Bidirectional ESD protection"
height 2.29
pads (2):
  rect 2.1x1.8 smd: 1(-2.2,0) 2(2.2,0)
Top Overlay:
  circle w0.25: c-3.65,0 r0.125
  lines w0.2: -2.55,-1.15 -2.55,-1.35 2.55,-1.35 2.55,-1.15 ; -2.55,1.15 -2.55,1.35 2.55,1.35 2.55,1.15
Mechanical 1:
  circle w0.05: c0,0 r0.35
  lines w0.05: -0.5,0 0.5,0 ; 0,-0.5 0,0.5 ; -3.4,-1.65 3.4,-1.65 3.4,1.65 -3.4,1.65 -3.4,-1.65
Mechanical 2:
  lines w0.001: -2.25,-1.395 2.25,-1.395 2.25,1.395 -2.25,1.395 -2.25,-1.395
Mechanical 3:
  lines w0.1: -2.452,-1.332 -2.452,1.332 ; -2.352,-1.332 -2.352,1.332 ; -2.252,-1.332 -2.252,1.332 ; -2.152,-1.332 -2.152,1.332 ; -2.052,-1.332 -2.052,1.332 ; -1.952,-1.332 -1.952,1.332 ; -1.852,-1.332 -1.852,1.332 ; -2.552,-1.332 2.552,-1.332 2.552,1.332 -2.552,1.332 ; -2.552,-1.332 -2.552,1.332 ; -2.552,-1.332 -2.552,1.332
3D body: height 2.29, standoff 0, extent -2.25,-1.395 2.25,1.395

## T_MC_CC4V-T1A [mm]
height 0.9
pads (2):
  rect 1.3x2.2 smd: 1(-2.1,0) 2(2.1,0)
Top Overlay:
  lines w0.127: -1.04,-1.02 1.04,-1.02 ; -1.04,1.02 1.04,1.02
Mechanical 1:
  lines w0.05: -2.92,-1.27 2.92,-1.27 2.92,1.27 -2.92,1.27 -2.92,-1.27
Mechanical 2:
  lines w0.001: -2.5,-0.95 2.5,-0.95 2.5,0.95 -2.5,0.95 -2.5,-0.95
Mechanical 3:
  lines w0.1: -2.44,-0.89 -2.44,0.89 2.44,0.89 2.44,-0.89 -2.44,-0.89
3D body: height 2.29, standoff 0, extent -2.5,-0.95 2.5,0.95

## T_MC_MCP2515T-I/ST [mm] "TSSOP20"
height 1.2
pads (20):
  rect 0.45x1.6 smd: 1(-2.925,-2.85) 2(-2.275,-2.85) 3(-1.625,-2.85) 4(-0.975,-2.85) 5(-0.325,-2.85) 6(0.325,-2.85) 7(0.975,-2.85) 8(1.625,-2.85) 9(2.275,-2.85) 10(2.925,-2.85) 11(2.925,2.85) 12(2.275,2.85) 13(1.625,2.85) 14(0.975,2.85) 15(0.325,2.85) 16(-0.325,2.85) 17(-0.975,2.85) 18(-1.625,2.85) 19(-2.275,2.85) 20(-2.925,2.85)
Top Overlay:
  circle w0.25: c-3.625,-2.85 r0.125
  lines w0.2: -3.3,-1.65 -3.3,-0.55 ccw(c-3.3,0) -3.3,0.55 -3.3,1.65 3.3,1.65 3.3,-1.65 -3.3,-1.65
Mechanical 1:
  circle w0.05: c0,0 r0.35
  lines w0.05: -0.5,0 0.5,0 ; 0,-0.5 0,0.5 ; -3.5,-3.9 -3.5,3.9 3.5,3.9 3.5,-3.9 -3.5,-3.9
Mechanical 2:
  lines w0.001: -3.3,-2.25 -3.3,2.25 3.3,2.25 3.3,-2.25 -3.3,-2.25
Mechanical 3:
  circle w0.1: c-1.961,-1.008 r0.3
  lines w0.1: -3.143,-1.817 -3.143,1.815 3.147,1.815 3.147,-1.817 -3.143,-1.817
3D body: height 1.2, standoff 0, extent -3.3,-2.25 3.3,2.25

## T_MILL-MAX_821-22-007-10-000101 [mm] "Pogo Pins"
height 3.48
pads (7):
  round 2.1 hole 0.6: 1(0,0) 2(2.54,0) 3(5.08,0) 4(7.62,0) 5(10.16,0) 6(12.7,0) 7(15.24,0)
Top Overlay:
  lines w0.2: -1.42,-1.42 -1.42,1.42 16.66,1.42 16.66,-1.42 -1.42,-1.42
  text "JTAG" at -1.85,-1.35 h0.75
Mechanical 1:
  lines w0.1: -1.63,-1.6 -1.63,1.6 16.87,1.6 16.87,-1.6 -1.63,-1.6
Mechanical 2:
  lines w0.01: -1.27,-1.27 16.51,-1.27 16.51,1.27 -1.27,1.27 -1.27,-1.27
Mechanical 3:
  lines w0.1: -1.27,-1.27 -1.27,1.27 16.51,1.27 16.51,-1.27 -1.27,-1.27
3D body "mill-max-P821-22-007-10-000101.step": height 3.5, standoff -1.74, extent -1.27,-1.27 16.51,1.27

## T_MILL-MAX_823-22-006-10-000101 [mm] "Pogo Pins"
height 3.48
pads (6):
  round 2.1 hole 0.6: 1(0,-1.27) 2(-2.54,-1.27) 3(2.54,1.27) 4(0,1.27) 5(-2.54,1.27) 6(2.54,-1.27)
Top Overlay:
  lines w0.2: -3.975,-2.7 -3.975,2.7 3.975,2.7 3.975,-2.7 -3.975,-2.7
  text "JTAG" at -1.375,3 h0.75
Mechanical 1:
  lines w0.1: -4.15,-2.875 -4.15,2.875 4.15,2.875 4.15,-2.875 -4.15,-2.875
Mechanical 2:
  lines w0.001: -3.81,-2.54 -3.81,2.54 3.81,2.54 3.81,-2.54 -3.81,-2.54
Mechanical 3:
  lines w0.1: -3.81,-2.54 -3.81,2.54 3.81,2.54 3.81,-2.54 -3.81,-2.54
3D body "mill-max-P823-22-006-10-000101.step": height 3.5, standoff -1.74, extent -3.81,-2.54 3.81,2.54

## T_MMMC_896-43-008-90-000000 [mm] "USB 2.0 double row, Type A"
height 15.6
pads (12):
  round 1.4 hole 0.9: L1(3.75,13.13) L2(6.25,13.13) L3(8.25,13.13) L4(10.75,13.13) U1(3.75,15.73) U2(6.25,15.73) U3(8.25,15.73) U4(10.75,15.73)
  round 3.5 hole 2.3: S1(0.68,10.43) S2(0.68,16.11) S3(13.82,16.11) S4(13.82,10.43)
Top Overlay:
  lines w0.2: 0.875,8.3 0.875,-0.12 13.625,-0.12 13.625,8.3 ; 0.875,12.5 0.875,14 ; 1.91,17.73 12.58,17.73 ; 13.625,12.5 13.625,14
Mechanical 1:
  lines w0.05: 0.901,8.484 0.901,0.299 -0.099,0.299 -0.099,-0.099 14.599,-0.099 14.599,0.299 13.599,0.299 13.599,8.485 ; 0.901,12.374 0.901,14.164 ; 0.902,8.484 cw(c0.685,10.429) 0.904,12.374 ; 0.903,14.164 cw(c0.679,16.109) 1.895,17.643 1.91,17.628 12.582,17.628 ; 12.582,17.631 cw(c13.815,16.11) 13.598,14.165 ; 13.599,12.375 13.599,14.165 ; 13.599,12.376 cw(c13.815,10.43) 13.6,8.485
Mechanical 2:
  lines w0.001: 0,0 14.5,0 14.5,0.2 13.5,0.2 13.5,17.53 1,17.53 1,0.2 0,0.2 0,0
Mechanical 3:
  lines w0.1: 0.9,0.299 0.9,17.629 13.599,17.629 13.599,0.299 14.6,0.299 14.6,-0.099 -0.099,-0.099 -0.099,0.299 0.901,0.299
3D body "61400826021.stp": height 16.17, standoff -3.58, extent -0.45,0 14.95,17.53